# Altium footprint library domino-spring-clamp.PcbLib: 258 footprints (part 3 of 17)
Each footprint in its own frame and in the unit in brackets; x right, y up, seen from the top. Pads: shape width x height; smd on the part's side, far side on the other; paste and mask are expansions set on the pad; w line width, h text height; cw(c..) or ccw(c..) is an arc to the next point about the centre after c.
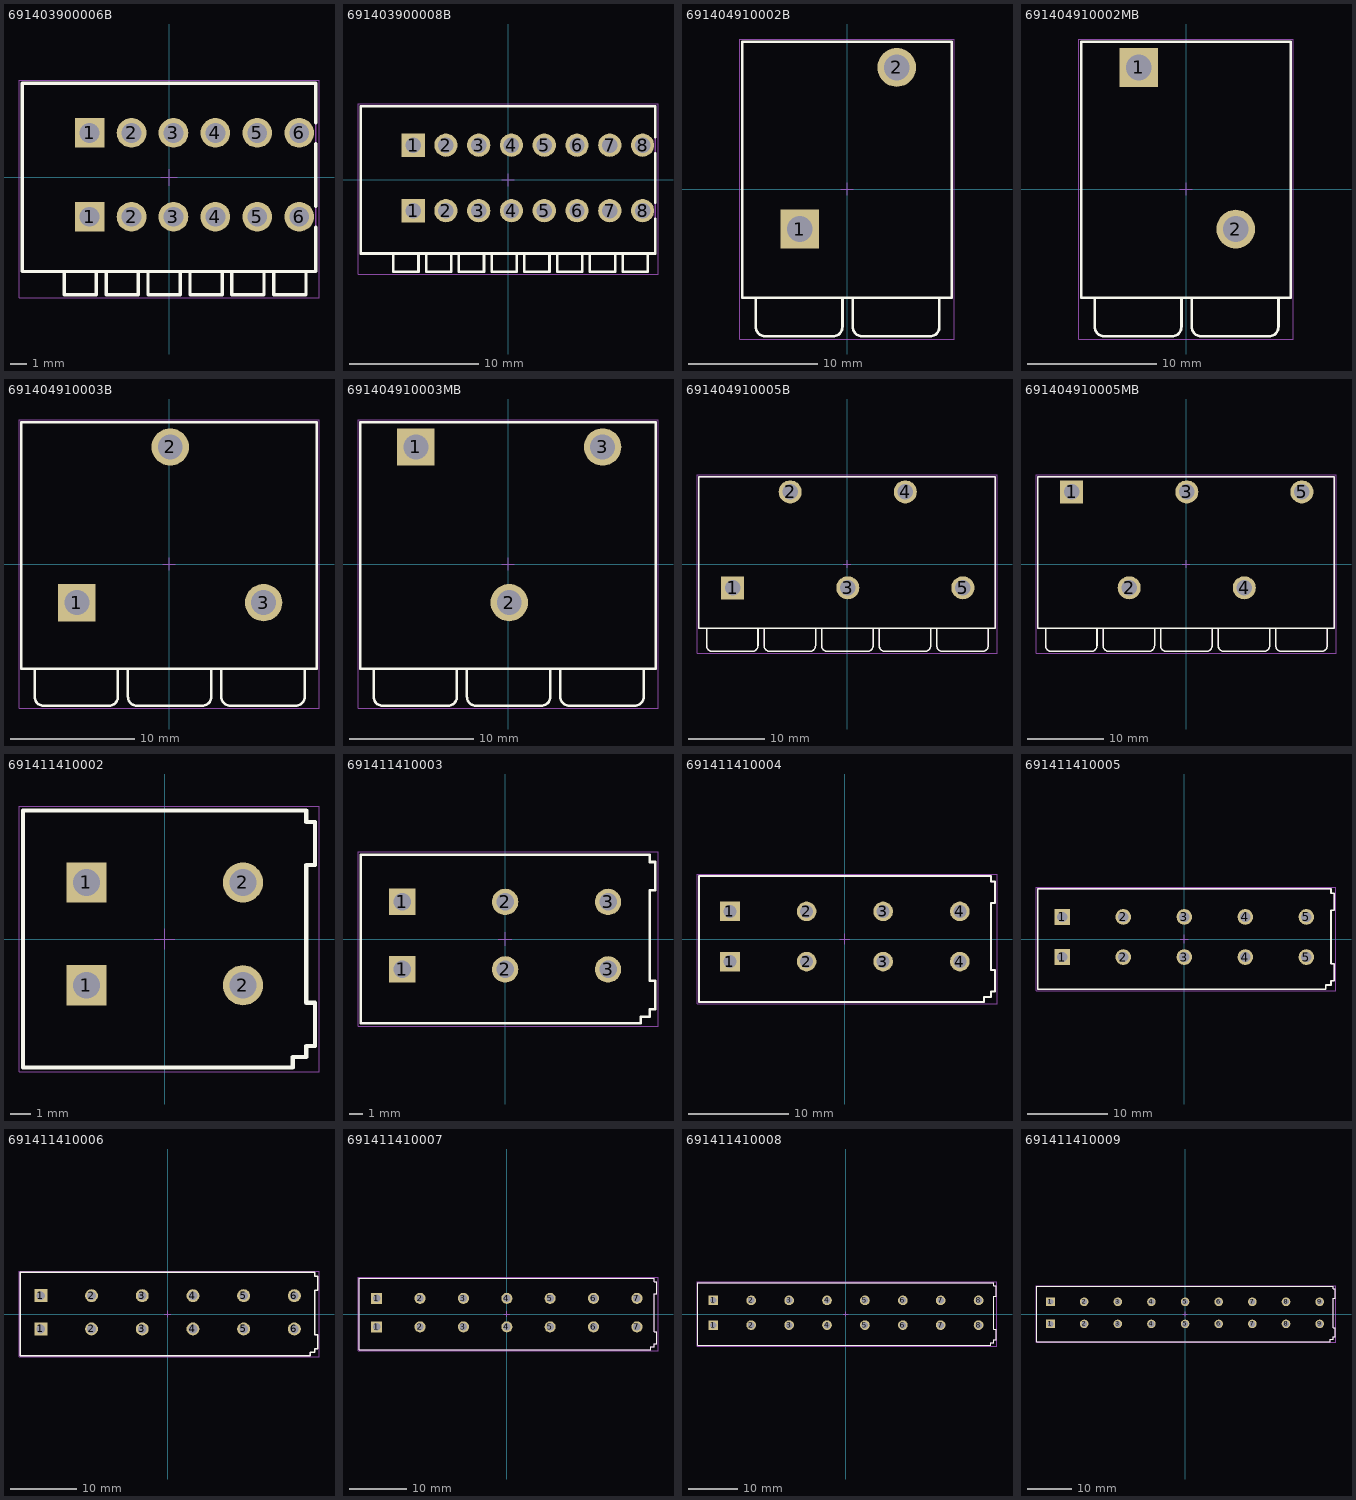
[diagram p2: the footprints below, top view; thin cyan lines are the x and y axes]

## 691403900006B [mm] "2,54mm - Spring clamp/Screwless - Vertical wire entry - 06p"
height 13.6
pads (12):
  rect 1.8x1.8 hole 1.2: 1(-4.81,-2.38) 1(-4.81,2.7)
  round 1.8 hole 1.2: 2(-2.27,-2.38) 2(-2.27,2.7) 3(0.27,-2.38) 3(0.27,2.7) 4(2.81,-2.38) 4(2.81,2.7) 5(5.35,-2.38) 5(5.35,2.7) 6(7.89,-2.38) 6(7.89,2.7)
Top Overlay:
  lines w0.2: -6.35,-5.7 -6.35,-7.1 -4.4,-7.1 -4.4,-5.7 ; -3.81,-5.7 -3.81,-7.1 -1.86,-7.1 -1.86,-5.7 ; -1.27,-5.7 -1.27,-7.1 0.68,-7.1 0.68,-5.7 ; 1.27,-5.7 1.27,-7.1 3.22,-7.1 3.22,-5.7 ; 3.81,-5.7 3.81,-7.1 5.76,-7.1 5.76,-5.7 ; 6.35,-5.7 6.35,-7.1 8.3,-7.1 8.3,-5.7 ; 8.89,-3 8.89,-5.7 -8.89,-5.7 -8.89,5.7 8.89,5.7 8.89,3.32 ; 8.89,-1.76 8.89,2.05
Mechanical 13:
  lines w0.1: -6.35,-5.7 -6.35,-7.1 -4.4,-7.1 -4.4,-5.7 ; -3.81,-5.7 -3.81,-7.1 -1.86,-7.1 -1.86,-5.7 ; -1.27,-5.7 -1.27,-7.1 0.68,-7.1 0.68,-5.7 ; 1.27,-5.7 1.27,-7.1 3.22,-7.1 3.22,-5.7 ; 3.81,-5.7 3.81,-7.1 5.76,-7.1 5.76,-5.7 ; 6.35,-5.7 6.35,-7.1 8.3,-7.1 8.3,-5.7 ; -8.89,-5.7 8.89,-5.7 8.89,5.7 -8.89,5.7 -8.89,-5.7
Mechanical 15:
  lines w0.05: -0.5,0 0.5,0 ; 0,-0.5 0,0.5 ; -9.09,-7.3 -9.09,5.9 9.09,5.9 9.09,-7.3 -9.09,-7.3
3D body "691403900006B.stp": height 13.65, standoff -3.45, extent -8.89,-7.1 8.89,5.7

## 691403900008B [mm] "2,54mm - Spring clamp/Screwless - Vertical wire entry - 08p"
height 13.6
pads (16):
  rect 1.8x1.8 hole 1.2: 1(-7.35,-2.38) 1(-7.35,2.7)
  round 1.8 hole 1.2: 2(-4.81,-2.38) 2(-4.81,2.7) 3(-2.27,-2.38) 3(-2.27,2.7) 4(0.27,-2.38) 4(0.27,2.7) 5(2.81,-2.38) 5(2.81,2.7) 6(5.35,-2.38) 6(5.35,2.7) 7(7.89,-2.38) 7(7.89,2.7) 8(10.43,-2.38) 8(10.43,2.7)
Top Overlay:
  lines w0.2: -8.89,-5.7 -8.89,-7.1 -6.94,-7.1 -6.94,-5.7 ; -6.35,-5.7 -6.35,-7.1 -4.4,-7.1 -4.4,-5.7 ; -3.81,-5.7 -3.81,-7.1 -1.86,-7.1 -1.86,-5.7 ; -1.27,-5.7 -1.27,-7.1 0.68,-7.1 0.68,-5.7 ; 1.27,-5.7 1.27,-7.1 3.22,-7.1 3.22,-5.7 ; 3.81,-5.7 3.81,-7.1 5.76,-7.1 5.76,-5.7 ; 6.35,-5.7 6.35,-7.1 8.3,-7.1 8.3,-5.7 ; 8.89,-5.7 8.89,-7.1 10.84,-7.1 10.84,-5.7 ; 11.43,-3 11.43,-5.7 -11.43,-5.7 -11.43,5.7 11.43,5.7 11.43,3.32 ; 11.43,-1.76 11.43,2.05
Mechanical 13:
  lines w0.1: -8.89,-5.7 -8.89,-7.1 -6.94,-7.1 -6.94,-5.7 ; -6.35,-5.7 -6.35,-7.1 -4.4,-7.1 -4.4,-5.7 ; -3.81,-5.7 -3.81,-7.1 -1.86,-7.1 -1.86,-5.7 ; -1.27,-5.7 -1.27,-7.1 0.68,-7.1 0.68,-5.7 ; 1.27,-5.7 1.27,-7.1 3.22,-7.1 3.22,-5.7 ; 3.81,-5.7 3.81,-7.1 5.76,-7.1 5.76,-5.7 ; 6.35,-5.7 6.35,-7.1 8.3,-7.1 8.3,-5.7 ; 8.89,-5.7 8.89,-7.1 10.84,-7.1 10.84,-5.7 ; -11.43,-5.7 11.43,-5.7 11.43,5.7 -11.43,5.7 -11.43,-5.7
Mechanical 15:
  lines w0.05: -0.5,0 0.5,0 ; 0,-0.5 0,0.5 ; -11.63,-7.3 -11.63,5.9 11.63,5.9 11.63,-7.3 -11.63,-7.3
3D body "691403900008B.stp": height 13.65, standoff -3.45, extent -11.43,-7.1 11.43,5.7

## 691404910002B [mm] "7.50 mm Screwless Clamp Power Connector, 2p"
height 24.1
pads (2):
  rect 3x3 hole 2: 1(-3.65,-3.1)
  round 3 hole 2: 2(3.85,9.4)
Top Overlay:
  lines w0.2: -7.05,-8.4 -7.05,-10.65 ccw(c-6.3,-10.65) -6.3,-11.4 -1.05,-11.4 ; -1.1,-11.4 ccw(c-1.1,-10.65) -0.35,-10.65 -0.35,-8.4 ; 0.45,-8.4 0.45,-10.65 ccw(c1.2,-10.65) 1.2,-11.4 6.45,-11.4 ; 6.4,-11.4 ccw(c6.4,-10.65) 7.15,-10.65 7.15,-8.4 ; -8.1,-8.4 8.1,-8.4 8.1,11.4 -8.1,11.4 -8.1,-8.4
Mechanical 13:
  lines w0.1: -7.05,-8.4 -7.05,-10.65 ccw(c-6.3,-10.65) -6.3,-11.4 -1.05,-11.4 ; -1.1,-11.4 ccw(c-1.1,-10.65) -0.35,-10.65 -0.35,-8.4 ; 0.45,-8.4 0.45,-10.65 ccw(c1.2,-10.65) 1.2,-11.4 6.45,-11.4 ; 6.4,-11.4 ccw(c6.4,-10.65) 7.15,-10.65 7.15,-8.4 ; -8.1,-8.4 -8.1,11.4 8.1,11.4 8.1,-8.4 -8.1,-8.4
Mechanical 15:
  lines w0.05: -0.5,0 0.5,0 ; 0,-0.5 0,0.5 ; -8.3,-11.6 8.3,-11.6 8.3,11.6 -8.3,11.6 -8.3,-11.6
3D body "691404910002B.stp": height 24.16, standoff -3.54, extent -8.1,-11.395 8.1,11.4

## 691404910002MB [mm] "7.50 mm Screwless Clamp Power Connector, 2p"
height 24.1
pads (2):
  rect 3x3 hole 2: 1(-3.65,9.4)
  round 3 hole 2: 2(3.85,-3.1)
Top Overlay:
  lines w0.2: -7.05,-8.4 -7.05,-10.65 ccw(c-6.3,-10.65) -6.3,-11.4 -1.05,-11.4 ; -1.1,-11.4 ccw(c-1.1,-10.65) -0.35,-10.65 -0.35,-8.4 ; 0.45,-8.4 0.45,-10.65 ccw(c1.2,-10.65) 1.2,-11.4 6.45,-11.4 ; 6.4,-11.4 ccw(c6.4,-10.65) 7.15,-10.65 7.15,-8.4 ; -8.1,-8.4 -8.1,11.4 8.1,11.4 8.1,-8.4 -8.1,-8.4
Mechanical 13:
  lines w0.1: -7.05,-8.4 -7.05,-10.65 ccw(c-6.3,-10.65) -6.3,-11.4 -1.05,-11.4 ; -1.1,-11.4 ccw(c-1.1,-10.65) -0.35,-10.65 -0.35,-8.4 ; 0.45,-8.4 0.45,-10.65 ccw(c1.2,-10.65) 1.2,-11.4 6.45,-11.4 ; 6.4,-11.4 ccw(c6.4,-10.65) 7.15,-10.65 7.15,-8.4 ; -8.1,-8.4 8.1,-8.4 8.1,11.4 -8.1,11.4 -8.1,-8.4
Mechanical 15:
  lines w0.05: -0.5,0 0.5,0 ; 0,-0.5 0,0.5 ; -8.3,-11.6 -8.3,11.6 8.3,11.6 8.3,-11.6 -8.3,-11.6
3D body "691404910002MB.stp": height 24.16, standoff -3.54, extent -8.1,-11.396 8.1,11.4

## 691404910003B [mm] "7.50 mm Screwless Clamp Power Connector, 3p"
height 24.1
pads (3):
  rect 3x3 hole 2: 1(-7.4,-3.1)
  round 3 hole 2: 2(0.1,9.4) 3(7.6,-3.1)
Top Overlay:
  lines w0.2: -10.8,-8.4 -10.8,-10.65 ccw(c-10.05,-10.65) -10.05,-11.4 -4.8,-11.4 ; -4.85,-11.4 ccw(c-4.85,-10.65) -4.1,-10.65 -4.1,-8.4 ; -3.3,-8.4 -3.3,-10.65 ccw(c-2.55,-10.65) -2.55,-11.4 2.7,-11.4 ; 2.65,-11.4 ccw(c2.65,-10.65) 3.4,-10.65 3.4,-8.4 ; 4.2,-8.4 4.2,-10.65 ccw(c4.95,-10.65) 4.95,-11.4 10.2,-11.4 ; 10.15,-11.4 ccw(c10.15,-10.65) 10.9,-10.65 10.9,-8.4 ; -11.85,-8.4 11.85,-8.4 11.85,11.4 -11.85,11.4 -11.85,-8.4
Mechanical 13:
  lines w0.1: -10.8,-8.4 -10.8,-10.65 ccw(c-10.05,-10.65) -10.05,-11.4 -4.8,-11.4 ; -4.85,-11.4 ccw(c-4.85,-10.65) -4.1,-10.65 -4.1,-8.4 ; -3.3,-8.4 -3.3,-10.65 ccw(c-2.55,-10.65) -2.55,-11.4 2.7,-11.4 ; 2.65,-11.4 ccw(c2.65,-10.65) 3.4,-10.65 3.4,-8.4 ; 4.2,-8.4 4.2,-10.65 ccw(c4.95,-10.65) 4.95,-11.4 10.2,-11.4 ; 10.15,-11.4 ccw(c10.15,-10.65) 10.9,-10.65 10.9,-8.4 ; -11.85,-8.4 -11.85,11.4 11.85,11.4 11.85,-8.4 -11.85,-8.4
Mechanical 15:
  lines w0.05: -0.5,0 0.5,0 ; 0,-0.5 0,0.5 ; -12.05,-11.6 12.05,-11.6 12.05,11.6 -12.05,11.6 -12.05,-11.6
3D body "691404910003B.stp": height 24.16, standoff -3.54, extent -11.85,-11.395 11.85,11.4

## 691404910003MB [mm] "7.50 mm Screwless Clamp Power Connector, 3p"
height 24.1
pads (3):
  rect 3x3 hole 2: 1(-7.4,9.4)
  round 3 hole 2: 2(0.1,-3.1) 3(7.6,9.4)
Top Overlay:
  lines w0.2: -10.8,-8.4 -10.8,-10.65 ccw(c-10.05,-10.65) -10.05,-11.4 -4.8,-11.4 ; -4.85,-11.4 ccw(c-4.85,-10.65) -4.1,-10.65 -4.1,-8.4 ; -3.3,-8.4 -3.3,-10.65 ccw(c-2.55,-10.65) -2.55,-11.4 2.7,-11.4 ; 2.65,-11.4 ccw(c2.65,-10.65) 3.4,-10.65 3.4,-8.4 ; 4.2,-8.4 4.2,-10.65 ccw(c4.95,-10.65) 4.95,-11.4 10.2,-11.4 ; 10.15,-11.4 ccw(c10.15,-10.65) 10.9,-10.65 10.9,-8.4 ; -11.85,-8.4 11.85,-8.4 11.85,11.4 -11.85,11.4 -11.85,-8.4
Mechanical 13:
  lines w0.1: -10.8,-8.4 -10.8,-10.65 ccw(c-10.05,-10.65) -10.05,-11.4 -4.8,-11.4 ; -4.85,-11.4 ccw(c-4.85,-10.65) -4.1,-10.65 -4.1,-8.4 ; -3.3,-8.4 -3.3,-10.65 ccw(c-2.55,-10.65) -2.55,-11.4 2.7,-11.4 ; 2.65,-11.4 ccw(c2.65,-10.65) 3.4,-10.65 3.4,-8.4 ; 4.2,-8.4 4.2,-10.65 ccw(c4.95,-10.65) 4.95,-11.4 10.2,-11.4 ; 10.15,-11.4 ccw(c10.15,-10.65) 10.9,-10.65 10.9,-8.4 ; -11.85,-8.4 -11.85,11.4 11.85,11.4 11.85,-8.4 -11.85,-8.4
Mechanical 15:
  lines w0.05: -0.5,0 0.5,0 ; 0,-0.5 0,0.5 ; -12.05,-11.6 12.05,-11.6 12.05,11.6 -12.05,11.6 -12.05,-11.6
3D body "691404910003MB.stp": height 24.16, standoff -3.54, extent -11.85,-11.396 11.85,11.4

## 691404910005B [mm] "7.50 mm Screwless Clamp Power Connector, 5p"
height 24.1
pads (5):
  rect 3x3 hole 2: 1(-14.9,-3.1)
  round 3 hole 2: 2(-7.4,9.4) 3(0.1,-3.1) 4(7.6,9.4) 5(15.1,-3.1)
Top Overlay:
  lines w0.2: -18.3,-8.4 -18.3,-10.65 ccw(c-17.55,-10.65) -17.55,-11.4 -12.3,-11.4 ; -12.35,-11.4 ccw(c-12.35,-10.65) -11.6,-10.65 -11.6,-8.4 ; -10.8,-8.4 -10.8,-10.65 ccw(c-10.05,-10.65) -10.05,-11.4 -4.8,-11.4 ; -4.85,-11.4 ccw(c-4.85,-10.65) -4.1,-10.65 -4.1,-8.4 ; -3.3,-8.4 -3.3,-10.65 ccw(c-2.55,-10.65) -2.55,-11.4 2.7,-11.4 ; 2.65,-11.4 ccw(c2.65,-10.65) 3.4,-10.65 3.4,-8.4 ; 4.2,-8.4 4.2,-10.65 ccw(c4.95,-10.65) 4.95,-11.4 10.2,-11.4 ; 10.15,-11.4 ccw(c10.15,-10.65) 10.9,-10.65 10.9,-8.4 ; 11.7,-8.4 11.7,-10.65 ccw(c12.45,-10.65) 12.45,-11.4 17.7,-11.4 ; 17.65,-11.4 ccw(c17.65,-10.65) 18.4,-10.65 18.4,-8.4 ; -19.35,-8.4 -19.35,11.4 19.35,11.4 19.35,-8.4 -19.35,-8.4
Mechanical 13:
  lines w0.1: -18.3,-8.4 -18.3,-10.65 ccw(c-17.55,-10.65) -17.55,-11.4 -12.3,-11.4 ; -12.35,-11.4 ccw(c-12.35,-10.65) -11.6,-10.65 -11.6,-8.4 ; -10.8,-8.4 -10.8,-10.65 ccw(c-10.05,-10.65) -10.05,-11.4 -4.8,-11.4 ; -4.85,-11.4 ccw(c-4.85,-10.65) -4.1,-10.65 -4.1,-8.4 ; -3.3,-8.4 -3.3,-10.65 ccw(c-2.55,-10.65) -2.55,-11.4 2.7,-11.4 ; 2.65,-11.4 ccw(c2.65,-10.65) 3.4,-10.65 3.4,-8.4 ; 4.2,-8.4 4.2,-10.65 ccw(c4.95,-10.65) 4.95,-11.4 10.2,-11.4 ; 10.15,-11.4 ccw(c10.15,-10.65) 10.9,-10.65 10.9,-8.4 ; 11.7,-8.4 11.7,-10.65 ccw(c12.45,-10.65) 12.45,-11.4 17.7,-11.4 ; 17.65,-11.4 ccw(c17.65,-10.65) 18.4,-10.65 18.4,-8.4 ; -19.35,-8.4 19.35,-8.4 19.35,11.4 -19.35,11.4 -19.35,-8.4
Mechanical 15:
  lines w0.05: -0.5,0 0.5,0 ; 0,-0.5 0,0.5 ; -19.55,-11.6 -19.55,11.6 19.55,11.6 19.55,-11.6 -19.55,-11.6
3D body "691404910005B.stp": height 24.16, standoff -3.54, extent -19.35,-11.395 19.35,11.4

## 691404910005MB [mm] "7.50 mm Screwless Clamp Power Connector, 5p"
height 24.1
pads (5):
  rect 3x3 hole 2: 1(-14.9,9.4)
  round 3 hole 2: 2(-7.4,-3.1) 3(0.1,9.4) 4(7.6,-3.1) 5(15.1,9.4)
Top Overlay:
  lines w0.2: -18.3,-8.4 -18.3,-10.65 ccw(c-17.55,-10.65) -17.55,-11.4 -12.3,-11.4 ; -12.35,-11.4 ccw(c-12.35,-10.65) -11.6,-10.65 -11.6,-8.4 ; -10.8,-8.4 -10.8,-10.65 ccw(c-10.05,-10.65) -10.05,-11.4 -4.8,-11.4 ; -4.85,-11.4 ccw(c-4.85,-10.65) -4.1,-10.65 -4.1,-8.4 ; -3.3,-8.4 -3.3,-10.65 ccw(c-2.55,-10.65) -2.55,-11.4 2.7,-11.4 ; 2.65,-11.4 ccw(c2.65,-10.65) 3.4,-10.65 3.4,-8.4 ; 4.2,-8.4 4.2,-10.65 ccw(c4.95,-10.65) 4.95,-11.4 10.2,-11.4 ; 10.15,-11.4 ccw(c10.15,-10.65) 10.9,-10.65 10.9,-8.4 ; 11.7,-8.4 11.7,-10.65 ccw(c12.45,-10.65) 12.45,-11.4 17.7,-11.4 ; 17.65,-11.4 ccw(c17.65,-10.65) 18.4,-10.65 18.4,-8.4 ; -19.35,-8.4 -19.35,11.4 19.35,11.4 19.35,-8.4 -19.35,-8.4
Mechanical 13:
  lines w0.1: -18.3,-8.4 -18.3,-10.65 ccw(c-17.55,-10.65) -17.55,-11.4 -12.3,-11.4 ; -12.35,-11.4 ccw(c-12.35,-10.65) -11.6,-10.65 -11.6,-8.4 ; -10.8,-8.4 -10.8,-10.65 ccw(c-10.05,-10.65) -10.05,-11.4 -4.8,-11.4 ; -4.85,-11.4 ccw(c-4.85,-10.65) -4.1,-10.65 -4.1,-8.4 ; -3.3,-8.4 -3.3,-10.65 ccw(c-2.55,-10.65) -2.55,-11.4 2.7,-11.4 ; 2.65,-11.4 ccw(c2.65,-10.65) 3.4,-10.65 3.4,-8.4 ; 4.2,-8.4 4.2,-10.65 ccw(c4.95,-10.65) 4.95,-11.4 10.2,-11.4 ; 10.15,-11.4 ccw(c10.15,-10.65) 10.9,-10.65 10.9,-8.4 ; 11.7,-8.4 11.7,-10.65 ccw(c12.45,-10.65) 12.45,-11.4 17.7,-11.4 ; 17.65,-11.4 ccw(c17.65,-10.65) 18.4,-10.65 18.4,-8.4 ; -19.35,-8.4 19.35,-8.4 19.35,11.4 -19.35,11.4 -19.35,-8.4
Mechanical 15:
  lines w0.05: -0.5,0 0.5,0 ; 0,-0.5 0,0.5 ; -19.55,-11.6 -19.55,11.6 19.55,11.6 19.55,-11.6 -19.55,-11.6
3D body "691404910005MB.stp": height 24.16, standoff -3.54, extent -19.35,-11.396 19.35,11.4

## 691411410002 [mm] "7.62 mm Screwless Horizontal Entry, 2p"
height 13.9
pads (4):
  rect 1.95x1.95 hole 1.3: 1(-3.81,-2.25) 1(-3.81,2.75)
  round 1.95 hole 1.3: 2(3.81,-2.25) 2(3.81,2.75)
Top Overlay:
  lines w0.2: -6.89,-6.25 6.23,-6.25 6.23,-5.75 6.89,-5.75 6.89,-5.2 7.31,-5.2 7.31,-3.1 6.89,-3.1 6.89,3.6 7.31,3.6 7.31,5.7 6.89,5.7 6.89,6.25 -6.89,6.25 -6.89,-6.25
Mechanical 13:
  lines w0.1: -6.89,-6.25 -6.89,6.25 6.89,6.25 6.89,5.7 7.31,5.7 7.31,3.6 6.89,3.6 6.89,-3.1 7.31,-3.1 7.31,-5.2 6.89,-5.2 6.89,-5.75 6.23,-5.75 6.23,-6.25 -6.89,-6.25
Mechanical 15:
  lines w0.05: -0.5,0 0.5,0 ; 0,-0.5 0,0.5 ; -7.09,-6.45 -7.09,6.45 7.51,6.45 7.51,-6.45 -7.09,-6.45
3D body "691411410002.stp": height 14, standoff -3.5, extent -6.89,-6.25 7.304,6.25

## 691411410003 [mm] "7.62 mm Screwless Horizontal Entry, 3p"
height 13.9
pads (6):
  rect 1.95x1.95 hole 1.3: 1(-7.62,-2.25) 1(-7.62,2.75)
  round 1.95 hole 1.3: 2(0,-2.25) 2(0,2.75) 3(7.62,-2.25) 3(7.62,2.75)
Top Overlay:
  lines w0.2: -10.7,-6.25 -10.7,6.25 10.7,6.25 10.7,5.7 11.12,5.7 11.12,3.6 10.7,3.6 10.7,-3.1 11.12,-3.1 11.12,-5.2 10.7,-5.2 10.7,-5.75 10.04,-5.75 10.04,-6.25 -10.7,-6.25
Mechanical 13:
  lines w0.1: -10.7,-6.25 10.04,-6.25 10.04,-5.75 10.7,-5.75 10.7,-5.2 11.12,-5.2 11.12,-3.1 10.7,-3.1 10.7,3.6 11.12,3.6 11.12,5.7 10.7,5.7 10.7,6.25 -10.7,6.25 -10.7,-6.25
Mechanical 15:
  lines w0.05: -0.5,0 0.5,0 ; 0,-0.5 0,0.5 ; -10.9,-6.45 11.32,-6.45 11.32,6.45 -10.9,6.45 -10.9,-6.45
3D body "691411410003.stp": height 14, standoff -3.5, extent -10.7,-6.25 11.111,6.25

## 691411410004 [mm] "7.62 mm Screwless Horizontal Entry, 4p"
height 13.9
pads (8):
  rect 1.95x1.95 hole 1.3: 1(-11.43,-2.25) 1(-11.43,2.75)
  round 1.95 hole 1.3: 2(-3.81,-2.25) 2(-3.81,2.75) 3(3.81,-2.25) 3(3.81,2.75) 4(11.43,-2.25) 4(11.43,2.75)
Top Overlay:
  lines w0.2: -14.51,-6.25 -14.51,6.25 14.51,6.25 14.51,5.7 14.93,5.7 14.93,3.6 14.51,3.6 14.51,-3.1 14.93,-3.1 14.93,-5.2 14.51,-5.2 14.51,-5.75 13.85,-5.75 13.85,-6.25 -14.51,-6.25
Mechanical 13:
  lines w0.1: -14.51,-6.25 13.85,-6.25 13.85,-5.75 14.51,-5.75 14.51,-5.2 14.93,-5.2 14.93,-3.1 14.51,-3.1 14.51,3.6 14.93,3.6 14.93,5.7 14.51,5.7 14.51,6.25 -14.51,6.25 -14.51,-6.25
Mechanical 15:
  lines w0.05: -0.5,0 0.5,0 ; 0,-0.5 0,0.5 ; -14.71,-6.45 15.13,-6.45 15.13,6.45 -14.71,6.45 -14.71,-6.45
3D body "691411410004.stp": height 14, standoff -3.5, extent -14.51,-6.25 14.918,6.25

## 691411410005 [mm] "7.62 mm Screwless Horizontal Entry, 5p"
height 13.9
pads (10):
  rect 1.95x1.95 hole 1.3: 1(-15.24,-2.25) 1(-15.24,2.75)
  round 1.95 hole 1.3: 2(-7.62,-2.25) 2(-7.62,2.75) 3(0,-2.25) 3(0,2.75) 4(7.62,-2.25) 4(7.62,2.75) 5(15.24,-2.25) 5(15.24,2.75)
Top Overlay:
  lines w0.2: -18.32,-6.25 -18.32,6.25 18.32,6.25 18.32,5.7 18.74,5.7 18.74,3.6 18.32,3.6 18.32,-3.1 18.74,-3.1 18.74,-5.2 18.32,-5.2 18.32,-5.75 17.66,-5.75 17.66,-6.25 -18.32,-6.25
Mechanical 13:
  lines w0.1: -18.32,-6.25 17.66,-6.25 17.66,-5.75 18.32,-5.75 18.32,-5.2 18.74,-5.2 18.74,-3.1 18.32,-3.1 18.32,3.6 18.74,3.6 18.74,5.7 18.32,5.7 18.32,6.25 -18.32,6.25 -18.32,-6.25
Mechanical 15:
  lines w0.05: -0.5,0 0.5,0 ; 0,-0.5 0,0.5 ; -18.52,-6.45 18.94,-6.45 18.94,6.45 -18.52,6.45 -18.52,-6.45
3D body "691411410005.stp": height 14, standoff -3.5, extent -18.32,-6.25 18.724,6.25

## 691411410006 [mm] "7.62 mm Screwless Horizontal Entry, 6p"
height 13.9
pads (12):
  rect 1.95x1.95 hole 1.3: 1(-19.05,-2.25) 1(-19.05,2.75)
  round 1.95 hole 1.3: 2(-11.43,-2.25) 2(-11.43,2.75) 3(-3.81,-2.25) 3(-3.81,2.75) 4(3.81,-2.25) 4(3.81,2.75) 5(11.43,-2.25) 5(11.43,2.75) 6(19.05,-2.25) 6(19.05,2.75)
Top Overlay:
  lines w0.2: -22.13,-6.25 -22.13,6.25 22.13,6.25 22.13,5.7 22.55,5.7 22.55,3.6 22.13,3.6 22.13,-3.1 22.55,-3.1 22.55,-5.2 22.13,-5.2 22.13,-5.75 21.47,-5.75 21.47,-6.25 -22.13,-6.25
Mechanical 13:
  lines w0.1: -22.13,-6.25 21.47,-6.25 21.47,-5.75 22.13,-5.75 22.13,-5.2 22.55,-5.2 22.55,-3.1 22.13,-3.1 22.13,3.6 22.55,3.6 22.55,5.7 22.13,5.7 22.13,6.25 -22.13,6.25 -22.13,-6.25
Mechanical 15:
  lines w0.05: -0.5,0 0.5,0 ; 0,-0.5 0,0.5 ; -22.33,-6.45 22.75,-6.45 22.75,6.45 -22.33,6.45 -22.33,-6.45
3D body "691411410006.stp": height 14, standoff -3.5, extent -22.13,-6.25 22.531,6.25

## 691411410007 [mm] "7.62 mm Screwless Horizontal Entry, 7p"
height 13.9
pads (14):
  rect 1.95x1.95 hole 1.3: 1(-22.86,-2.25) 1(-22.86,2.75)
  round 1.95 hole 1.3: 2(-15.24,-2.25) 2(-15.24,2.75) 3(-7.62,-2.25) 3(-7.62,2.75) 4(0,-2.25) 4(0,2.75) 5(7.62,-2.25) 5(7.62,2.75) 6(15.24,-2.25) 6(15.24,2.75) 7(22.86,-2.25) 7(22.86,2.75)
Top Overlay:
  lines w0.2: -25.94,-6.25 -25.94,6.25 25.94,6.25 25.94,5.7 26.36,5.7 26.36,3.6 25.94,3.6 25.94,-3.1 26.36,-3.1 26.36,-5.2 25.94,-5.2 25.94,-5.75 25.28,-5.75 25.28,-6.25 -25.94,-6.25
Mechanical 13:
  lines w0.1: -25.94,-6.25 25.28,-6.25 25.28,-5.75 25.94,-5.75 25.94,-5.2 26.36,-5.2 26.36,-3.1 25.94,-3.1 25.94,3.6 26.36,3.6 26.36,5.7 25.94,5.7 25.94,6.25 -25.94,6.25 -25.94,-6.25
Mechanical 15:
  lines w0.05: -0.5,0 0.5,0 ; 0,-0.5 0,0.5 ; -26.14,-6.45 26.56,-6.45 26.56,6.45 -26.14,6.45 -26.14,-6.45
3D body "691411410007.stp": height 14, standoff -3.5, extent -25.94,-6.25 26.337,6.25

## 691411410008 [mm] "7.62 mm Screwless Horizontal Entry, 8p"
height 13.9
pads (16):
  rect 1.95x1.95 hole 1.3: 1(-26.67,-2.25) 1(-26.67,2.75)
  round 1.95 hole 1.3: 2(-19.05,-2.25) 2(-19.05,2.75) 3(-11.43,-2.25) 3(-11.43,2.75) 4(-3.81,-2.25) 4(-3.81,2.75) 5(3.81,-2.25) 5(3.81,2.75) 6(11.43,-2.25) 6(11.43,2.75) 7(19.05,-2.25) 7(19.05,2.75) 8(26.67,-2.25) 8(26.67,2.75)
Top Overlay:
  lines w0.2: -29.75,-6.25 -29.75,6.25 29.75,6.25 29.75,5.7 30.17,5.7 30.17,3.6 29.75,3.6 29.75,-3.1 30.17,-3.1 30.17,-5.2 29.75,-5.2 29.75,-5.75 29.09,-5.75 29.09,-6.25 -29.75,-6.25
Mechanical 13:
  lines w0.1: -29.75,-6.25 29.09,-6.25 29.09,-5.75 29.75,-5.75 29.75,-5.2 30.17,-5.2 30.17,-3.1 29.75,-3.1 29.75,3.6 30.17,3.6 30.17,5.7 29.75,5.7 29.75,6.25 -29.75,6.25 -29.75,-6.25
Mechanical 15:
  lines w0.05: -0.5,0 0.5,0 ; 0,-0.5 0,0.5 ; -29.95,-6.45 30.37,-6.45 30.37,6.45 -29.95,6.45 -29.95,-6.45
3D body "691411410008.stp": height 14, standoff -3.5, extent -29.75,-6.25 30.144,6.25

## 691411410009 [mm] "7.62 mm Screwless Horizontal Entry, 9p"
height 13.9
pads (18):
  rect 1.95x1.95 hole 1.3: 1(-30.48,-2.25) 1(-30.48,2.75)
  round 1.95 hole 1.3: 2(-22.86,-2.25) 2(-22.86,2.75) 3(-15.24,-2.25) 3(-15.24,2.75) 4(-7.62,-2.25) 4(-7.62,2.75) 5(0,-2.25) 5(0,2.75) 6(7.62,-2.25) 6(7.62,2.75) 7(15.24,-2.25) 7(15.24,2.75) 8(22.86,-2.25) 8(22.86,2.75) 9(30.48,-2.25) 9(30.48,2.75)
Top Overlay:
  lines w0.2: -33.56,-6.25 32.9,-6.25 32.9,-5.75 33.56,-5.75 33.56,-5.2 33.98,-5.2 33.98,-3.1 33.56,-3.1 33.56,3.6 33.98,3.6 33.98,5.7 33.56,5.7 33.56,6.25 -33.56,6.25 -33.56,-6.25
Mechanical 13:
  lines w0.1: -33.56,-6.25 -33.56,6.25 33.56,6.25 33.56,5.7 33.98,5.7 33.98,3.6 33.56,3.6 33.56,-3.1 33.98,-3.1 33.98,-5.2 33.56,-5.2 33.56,-5.75 32.9,-5.75 32.9,-6.25 -33.56,-6.25
Mechanical 15:
  lines w0.05: -0.5,0 0.5,0 ; 0,-0.5 0,0.5 ; -33.76,-6.45 -33.76,6.45 34.18,6.45 34.18,-6.45 -33.76,-6.45
3D body "691411410009.stp": height 14, standoff -3.5, extent -33.56,-6.25 33.951,6.25